# Altium footprint library 20210518.PcbLib: 414 footprints (part 7 of 26)
Each footprint in its own frame and in the unit in brackets; x right, y up, seen from the top. Pads: shape width x height; smd on the part's side, far side on the other; paste and mask are expansions set on the pad; w line width, h text height; cw(c..) or ccw(c..) is an arc to the next point about the centre after c.
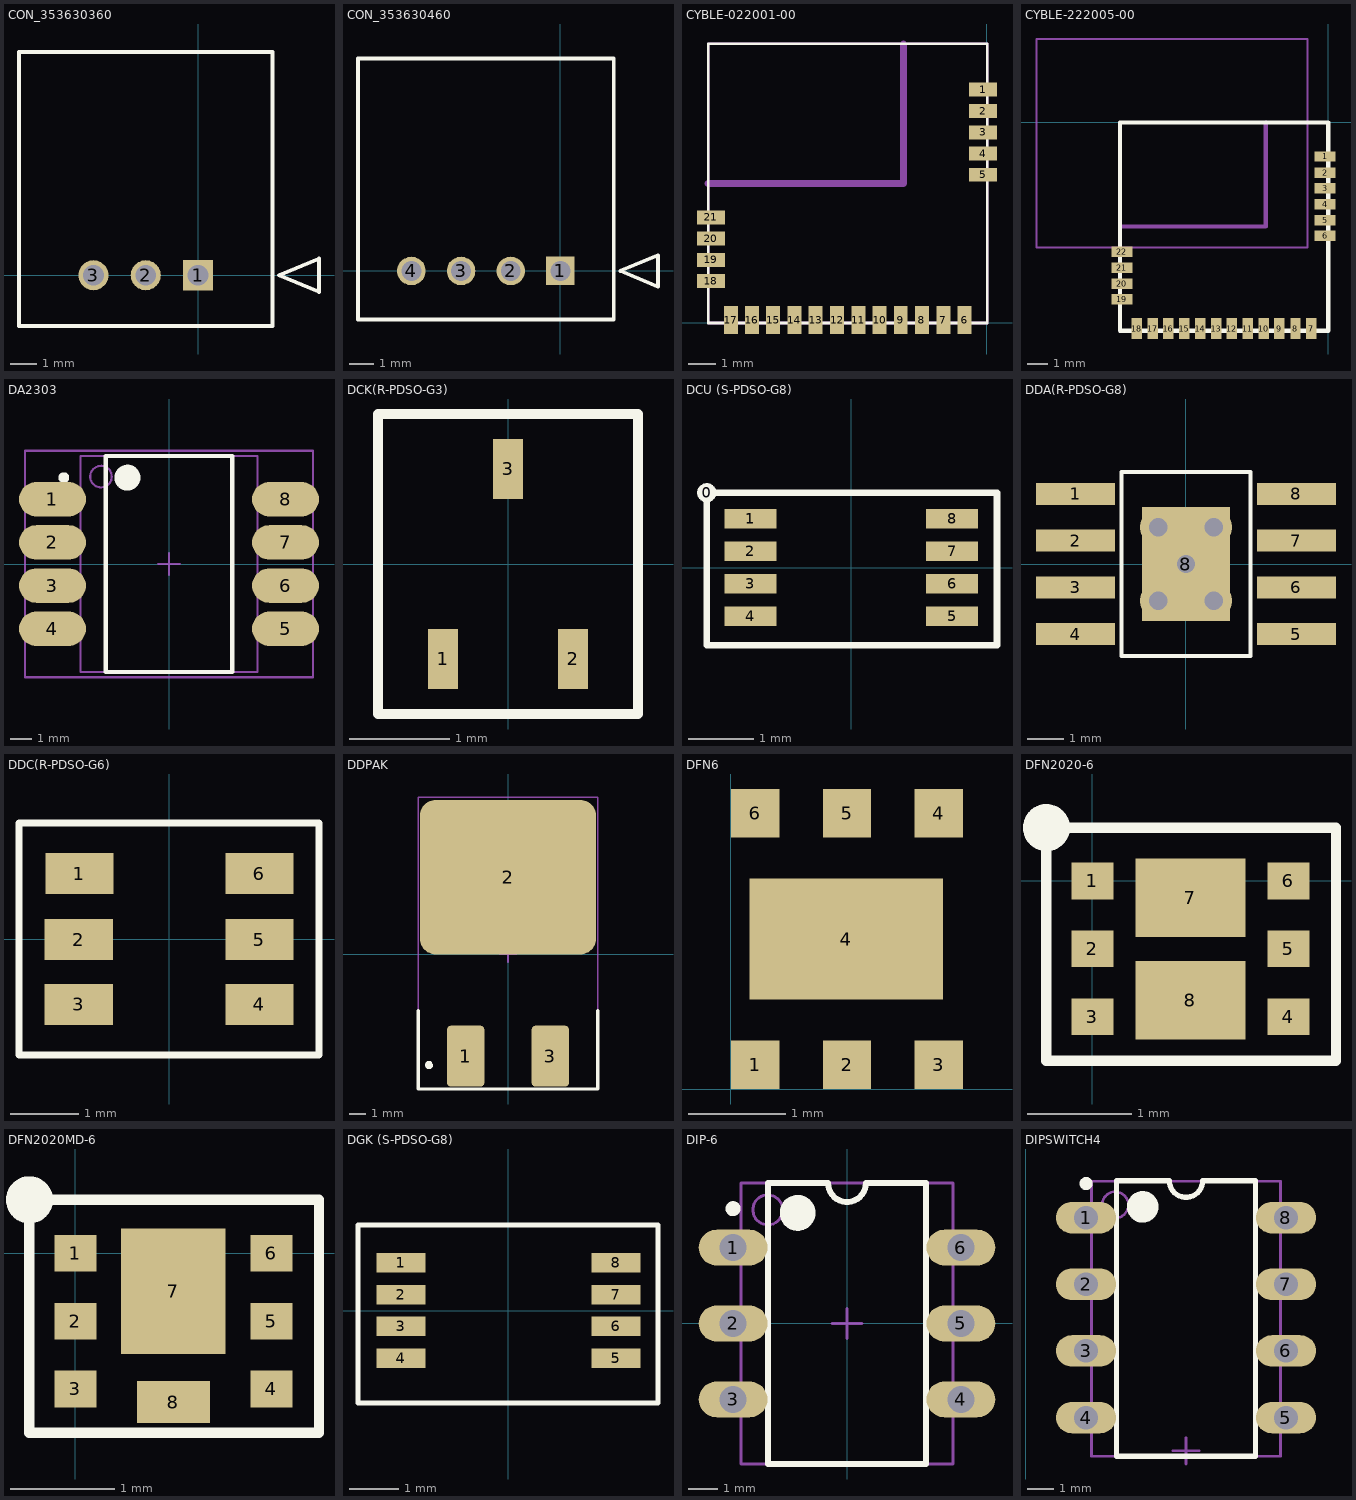
[diagram p6: the footprints below, top view; thin cyan lines are the x and y axes]

## CON_353630360 [mm]
pads (3):
  rect 1.15x1.15 hole 0.8 mask-25.4: 1(0,0)
  round 1.15 hole 0.8 mask-25.4: 2(-2,0) 3(-4,0)
Top Overlay:
  lines w0.152: -6.85,-1.95 -6.85,8.55 2.85,8.55 2.85,-1.95 -6.85,-1.95 ; 3.104,0 4.628,0.635 4.628,-0.635 3.104,0
Top Solder:
  region: -0.651,-0.651 0.651,-0.651 0.651,0.651 -0.651,0.651
  region: -2,0.657 -2.17,0.634 -2.328,0.569 -2.464,0.464 -2.569,0.328 -2.634,0.17 -2.657,0 -2.634,-0.17 -2.569,-0.328 -2.464,-0.464 -2.328,-0.569 -2.17,-0.634 -2,-0.657 -1.83,-0.634 -1.672,-0.569 -1.536,-0.464 -1.431,-0.328 -1.366,-0.17 -1.343,0 -1.366,0.17 -1.431,0.328 -1.536,0.464 -1.672,0.569 -1.83,0.634
  region: -4,0.657 -4.17,0.634 -4.328,0.569 -4.464,0.464 -4.569,0.328 -4.634,0.17 -4.657,0 -4.634,-0.17 -4.569,-0.328 -4.464,-0.464 -4.328,-0.569 -4.17,-0.634 -4,-0.657 -3.83,-0.634 -3.672,-0.569 -3.536,-0.464 -3.431,-0.328 -3.366,-0.17 -3.343,0 -3.366,0.17 -3.431,0.328 -3.536,0.464 -3.672,0.569 -3.83,0.634
Bottom Solder:
  region: -0.651,-0.651 0.651,-0.651 0.651,0.651 -0.651,0.651
  region: -2,0.657 -2.17,0.634 -2.328,0.569 -2.464,0.464 -2.569,0.328 -2.634,0.17 -2.657,0 -2.634,-0.17 -2.569,-0.328 -2.464,-0.464 -2.328,-0.569 -2.17,-0.634 -2,-0.657 -1.83,-0.634 -1.672,-0.569 -1.536,-0.464 -1.431,-0.328 -1.366,-0.17 -1.343,0 -1.366,0.17 -1.431,0.328 -1.536,0.464 -1.672,0.569 -1.83,0.634
  region: -4,0.657 -4.17,0.634 -4.328,0.569 -4.464,0.464 -4.569,0.328 -4.634,0.17 -4.657,0 -4.634,-0.17 -4.569,-0.328 -4.464,-0.464 -4.328,-0.569 -4.17,-0.634 -4,-0.657 -3.83,-0.634 -3.672,-0.569 -3.536,-0.464 -3.431,-0.328 -3.366,-0.17 -3.343,0 -3.366,0.17 -3.431,0.328 -3.536,0.464 -3.672,0.569 -3.83,0.634
3D body: height 5.55, standoff -3.15, extent -6.831,-2.008 2.869,8.492

## CON_353630460 [mm]
pads (4):
  rect 1.15x1.15 hole 0.8 mask-25.4: 1(0,0)
  round 1.15 hole 0.8 mask-25.4: 2(-2,0) 3(-4,0) 4(-6,0)
Top Overlay:
  lines w0.152: -8.15,-1.95 -8.15,8.55 2.15,8.55 2.15,-1.95 -8.15,-1.95 ; 2.404,0 3.928,0.635 3.928,-0.635 2.404,0
Top Solder:
  region: -0.651,-0.651 0.651,-0.651 0.651,0.651 -0.651,0.651
  region: -2,0.657 -2.17,0.634 -2.328,0.569 -2.464,0.464 -2.569,0.328 -2.634,0.17 -2.657,0 -2.634,-0.17 -2.569,-0.328 -2.464,-0.464 -2.328,-0.569 -2.17,-0.634 -2,-0.657 -1.83,-0.634 -1.672,-0.569 -1.536,-0.464 -1.431,-0.328 -1.366,-0.17 -1.343,0 -1.366,0.17 -1.431,0.328 -1.536,0.464 -1.672,0.569 -1.83,0.634
  region: -4,0.657 -4.17,0.634 -4.328,0.569 -4.464,0.464 -4.569,0.328 -4.634,0.17 -4.657,0 -4.634,-0.17 -4.569,-0.328 -4.464,-0.464 -4.328,-0.569 -4.17,-0.634 -4,-0.657 -3.83,-0.634 -3.672,-0.569 -3.536,-0.464 -3.431,-0.328 -3.366,-0.17 -3.343,0 -3.366,0.17 -3.431,0.328 -3.536,0.464 -3.672,0.569 -3.83,0.634
  region: -6,0.657 -6.17,0.634 -6.328,0.569 -6.464,0.464 -6.569,0.328 -6.634,0.17 -6.657,0 -6.634,-0.17 -6.569,-0.328 -6.464,-0.464 -6.328,-0.569 -6.17,-0.634 -6,-0.657 -5.83,-0.634 -5.672,-0.569 -5.536,-0.464 -5.431,-0.328 -5.366,-0.17 -5.343,0 -5.366,0.17 -5.431,0.328 -5.536,0.464 -5.672,0.569 -5.83,0.634
Bottom Solder:
  region: -0.651,-0.651 0.651,-0.651 0.651,0.651 -0.651,0.651
  region: -2,0.657 -2.17,0.634 -2.328,0.569 -2.464,0.464 -2.569,0.328 -2.634,0.17 -2.657,0 -2.634,-0.17 -2.569,-0.328 -2.464,-0.464 -2.328,-0.569 -2.17,-0.634 -2,-0.657 -1.83,-0.634 -1.672,-0.569 -1.536,-0.464 -1.431,-0.328 -1.366,-0.17 -1.343,0 -1.366,0.17 -1.431,0.328 -1.536,0.464 -1.672,0.569 -1.83,0.634
  region: -4,0.657 -4.17,0.634 -4.328,0.569 -4.464,0.464 -4.569,0.328 -4.634,0.17 -4.657,0 -4.634,-0.17 -4.569,-0.328 -4.464,-0.464 -4.328,-0.569 -4.17,-0.634 -4,-0.657 -3.83,-0.634 -3.672,-0.569 -3.536,-0.464 -3.431,-0.328 -3.366,-0.17 -3.343,0 -3.366,0.17 -3.431,0.328 -3.536,0.464 -3.672,0.569 -3.83,0.634
  region: -6,0.657 -6.17,0.634 -6.328,0.569 -6.464,0.464 -6.569,0.328 -6.634,0.17 -6.657,0 -6.634,-0.17 -6.569,-0.328 -6.464,-0.464 -6.328,-0.569 -6.17,-0.634 -6,-0.657 -5.83,-0.634 -5.672,-0.569 -5.536,-0.464 -5.431,-0.328 -5.366,-0.17 -5.343,0 -5.366,0.17 -5.431,0.328 -5.536,0.464 -5.672,0.569 -5.83,0.634
3D body: height 5.55, standoff -3.15, extent -8.223,-1.983 2.077,8.517

## CYBLE-022001-00 [mm] "EZ-BLE™ PRoC™ Module"
pads (21):
  rect 1x0.5 smd: 1(-0.141,8.344) 2(-0.141,7.574) 3(-0.141,6.814) 4(-0.141,6.054) 5(-0.141,5.294) 18(-9.888,1.484) 19(-9.888,2.244) 20(-9.888,3.004) 21(-9.888,3.764)
  rect 0.5x1 smd: 6(-0.798,0.084) 7(-1.558,0.084) 8(-2.328,0.084) 9(-3.088,0.084) 10(-3.848,0.084) 11(-4.608,0.084) 12(-5.368,0.084) 13(-6.138,0.084) 14(-6.898,0.084) 15(-7.658,0.084) 16(-8.418,0.084) 17(-9.178,0.084)
Top Overlay:
  lines w0.1: -9.988,-0.016 -9.988,9.984 0.012,9.984 0.012,-0.016 -9.988,-0.016
Mechanical 15:
  lines w0.1: -9.988,-0.016 0.012,-0.016 0.012,9.984 -9.988,9.984 -9.988,-0.016
  lines w0.254: -9.988,4.984 -2.988,4.984 -2.988,9.984
  text "Antenna area" at -9.388,7.384 h1
3D body: height 1.5, standoff 0, extent -9.988,-0.016 0.012,9.984

## CYBLE-222005-00 [mm] "EZ-BLE™ PRoC™ Module, flash: 256KB"
height 1.6
pads (22):
  rect 1x0.5 smd: 1(-0.152,-1.64) 2(-0.152,-2.41) 3(-0.152,-3.17) 4(-0.152,-3.93) 5(-0.152,-4.69) 6(-0.152,-5.45) 19(-9.9,-8.5) 20(-9.9,-7.74) 21(-9.9,-6.98) 22(-9.9,-6.22)
  rect 0.5x1 smd: 7(-0.81,-9.9) 8(-1.57,-9.9) 9(-2.34,-9.9) 10(-3.1,-9.9) 11(-3.86,-9.9) 12(-4.62,-9.9) 13(-5.38,-9.9) 14(-6.15,-9.9) 15(-6.91,-9.9) 16(-7.67,-9.9) 17(-8.43,-9.9) 18(-9.19,-9.9)
Top Overlay:
  lines w0.2: -10,-10 -10,0 0,0 0,-10 -10,-10
Mechanical 13:
  lines w0.1: -14,-6 -14,4 -1,4 -1,-6 -14,-6
  text "Antena Cut Out" at -10,2 h1
Mechanical 15:
  lines w0.1: -10,-10 0,-10 0,0 -10,0 -10,-10
  lines w0.2: -10,-5 -3,-5 -3,0
  text "Antenna area" at -9.4,-2.6 h1
3D body: height 1.5, standoff 0, extent -10,-10 0,0

## DA2303 [mm] "8-Leads, Body 10.0x8.2mm (max), Pitch 2.00mm, IPC Medium Density"
height 5.97
pads (8):
  oval 3.1x1.6 smd: 1(-5.4,3) 2(-5.4,1) 3(-5.4,-1) 4(-5.4,-3) 5(5.4,-3) 6(5.4,-1) 7(5.4,1) 8(5.4,3)
Top Overlay:
  circle w0.25: c-4.875,4 r0.125
  circle w0.6: c-1.925,4 r0.3
  lines w0.2: -2.925,-5 -2.925,5 2.925,5 2.925,-5 -2.925,-5
Mechanical 13:
  circle w0.1: c-3.15,4.05 r0.5
  lines w0.1: -4.1,-5 -4.1,5 4.1,5 4.1,-5 -4.1,-5
Mechanical 15:
  lines w0.1: -0.5,0 0.5,0 ; 0,-0.5 0,0.5 ; -6.675,-5.25 -6.675,5.25 6.675,5.25 6.675,-5.25 -6.675,-5.25
3D body: height 5.95, standoff -0.02, extent -6.01,-5.025 6.06,4.975

## DCK(R-PDSO-G3) [mm] "PLASTIC  SMALL OUTLINE PACKAGE"
height 1.1
pads (3):
  rect 0.3x0.6 smd: 1(-0.65,-0.95) 2(0.65,-0.95) 3(0,0.95)
Top Overlay:
  lines w0.1: -1.3,-1.5 1.3,-1.5 1.3,1.5 -1.3,1.5 -1.3,-1.5
3D body: height 0.15, standoff 0.1, extent 0.4,-1.2 0.9,-0.7
3D body: height 0.15, standoff 0.1, extent -0.9,-1.2 -0.4,-0.7
3D body: height 0.15, standoff 0.1, extent -0.25,0.7 0.25,1.2
3D body: height 1.11, standoff 1.1, extent -0.9,-0.45 -0.65,-0.2
3D body: height 1.1, standoff 0, extent -1.075,-0.7 1.075,0.7

## DCU (S-PDSO-G8) [mm] "PowerPAD PLASTIC  SMALL OUTLINE"
pads (9):
  round 0.3 on Top Overlay: 0(-2.22,1.15)
  rect 0.8x0.3 smd: 1(-1.55,0.75) 2(-1.55,0.25) 3(-1.55,-0.25) 4(-1.55,-0.75) 5(1.55,-0.75) 6(1.55,-0.25) 7(1.55,0.25) 8(1.55,0.75)
Top Overlay:
  lines w0.1: -2.22,-1.19 2.24,-1.19 2.24,1.15 -2.22,1.15 -2.22,-1.19
3D body: height 0.9, standoff 0, extent -1.587,-1.01 1.52,0.99

## DDA(R-PDSO-G8) [mm] "PowerPAD PLASTIC  SMALL OUTLINE"
pads (9):
  rect 2.15x0.6 smd: 1(-3,1.905) 2(-3,0.635) 3(-3,-0.635) 4(-3,-1.905) 5(3,-1.905) 6(3,-0.635) 7(3,0.635) 8(3,1.905)
  rect 2.4x3.1 smd: 8(0,0)
via -0.75,1 diameter 1 hole 0.5
via 0.75,1 diameter 1 hole 0.5
via 0.75,-1 diameter 1 hole 0.5
via -0.75,-1 diameter 1 hole 0.5
via 0,0 diameter 1 hole 0.5
Top Overlay:
  lines w0.1: -1.75,-2.5 -1.75,2.5 1.75,2.5 1.75,-2.5 -1.75,-2.5
3D body: height 1.7, standoff 0, extent -2.767,-2.426 3.227,2.4

## DDC(R-PDSO-G6) [mm] "TI"
height 1.1
pads (6):
  rect 1x0.6 smd: 1(-1.315,0.96) 2(-1.325,-0.01) 3(-1.325,-0.96) 4(1.325,-0.96) 5(1.325,-0.01) 6(1.325,0.96)
Top Overlay:
  lines w0.1: -2.2,-1.7 -2.2,1.7 2.2,1.7 2.2,-1.7 -2.2,-1.7
3D body: height 0.97, standoff 0, extent -1.4,-1.45 1.4,1.45

## DDPAK [mm] "TO-263-3, D²Pak (2 Leads + Tab), TO-263AB"
height 4.83
pads (3):
  rrect20% 2.32x3.81 smd: 1(-2.64,-6.35) 3(2.64,-6.35)
  rrect20% 11x9.65 smd: 2(0,4.825)
Top Overlay:
  lines w0.2: -5.6,-3.5 -5.6,-8.4 5.6,-8.4 5.6,-3.5
  lines w0.25: -4.86,-6.793 ccw(c-4.925,-6.9) -4.8,-6.9
Mechanical 13:
  lines w0.1: -5.6,-8.4 -5.6,9.8 5.6,9.8 5.6,-8.4 -5.6,-8.4
Mechanical 15:
  lines w0.1: -0.5,0 0.5,0 ; 0,-0.5 0,0.5
3D body: height 4.98, standoff -0.03, extent -5.08,-7.016 5.08,8.248

## DFN6 [mm] "DFN6 (3x3 mm)"
height 1
pads (7):
  rect 0.5x0.5 smd: 1(0.25,0.25) 2(1.2,0.25) 3(2.15,0.25) 4(2.15,2.85) 5(1.2,2.85) 6(0.25,2.85)
  rect 2x1.25 smd: 4(1.19,1.55)
3D body: height 0.75, standoff -0.05, extent -0.32,0 2.68,3.1

## DFN2020-6 [mm]
height 0.75
pads (8):
  rect 0.4x0.35 smd: 1(0,0) 2(0,-0.65) 3(0,-1.3) 4(1.875,-1.3) 5(1.875,-0.65) 6(1.875,0)
  rect 1.05x0.75 smd: 7(0.937,-0.16) 8(0.937,-1.14)
Top Overlay:
  circle w0.25: c-0.44,0.51 r0.1
  lines w0.1: -0.44,-1.72 2.33,-1.72 2.33,0.51 -0.44,0.51 -0.44,-1.72
3D body: height 0.77, standoff 0, extent -0.06,-1.65 1.94,0.35

## DFN2020MD-6 [mm]
height 0.75
pads (8):
  rect 0.4x0.35 smd: 1(0,0) 2(0,-0.65) 3(0,-1.3) 4(1.875,-1.3) 5(1.875,-0.65) 6(1.875,0)
  rect 1x1.2 smd: 7(0.937,-0.365)
  rect 0.7x0.4 smd: 8(0.937,-1.425)
Top Overlay:
  circle w0.25: c-0.44,0.51 r0.1
  lines w0.1: -0.44,-1.72 2.33,-1.72 2.33,0.51 -0.44,0.51 -0.44,-1.72
3D body: height 0.77, standoff 0, extent -0.06,-1.65 1.94,0.35

## DGK (S-PDSO-G8) [mm] "PowerPAD PLASTIC  SMALL OUTLINE"
pads (8):
  rect 1x0.4 smd: 1(-2.2,0.975) 2(-2.2,0.325) 3(-2.2,-0.325) 4(-2.2,-0.975) 5(2.2,-0.975) 6(2.2,-0.325) 7(2.2,0.325) 8(2.2,0.975)
Top Overlay:
  lines w0.1: -3.08,-1.895 3.06,-1.895 3.06,1.755 -3.08,1.755 -3.08,-1.895
3D body: height 0.94, standoff -0.02, extent -2.491,-1.483 2.411,1.514

## DIP-6 [mm]
pads (6):
  oval 2.3x1.2 hole 0.9: 1(-3.81,2.54) 2(-3.81,0) 3(-3.81,-2.54) 4(3.81,-2.54) 5(3.81,0) 6(3.81,2.54)
Top Overlay:
  circle w0.6: c-1.65,3.7 r0.3
  circle w0.25: c-3.81,3.84 r0.125
  lines w0.2: -2.65,-4.7 2.65,-4.7 2.65,4.7 0.635,4.7 cw(c0,4.7) -0.635,4.7 -2.65,4.7 -2.65,-4.7
Mechanical 13:
  circle w0.1: c-2.65,3.8 r0.5
  lines w0.1: -3.55,-4.7 3.55,-4.7 3.55,4.7 -3.55,4.7 -3.55,-4.7
Mechanical 15:
  lines w0.1: -0.5,0 0.5,0 ; 0,-0.5 0,0.5
3D body: height 4.7, standoff -2.6, extent -3.87,-3.56 4,3.56

## DIPSWITCH4 [mm]
pads (8):
  oval 2.3x1.2 hole 0.9: 1(2.29,13.09) 2(2.29,10.55) 3(2.29,8.01) 4(2.29,5.47) 5(9.91,5.47) 6(9.91,8.01) 7(9.91,10.55) 8(9.91,13.09)
Top Overlay:
  circle w0.25: c2.29,14.39 r0.125
  circle w0.6: c4.45,13.5 r0.3
  lines w0.2: 3.45,4 3.45,14.5 5.465,14.5 ccw(c6.1,14.5) 6.735,14.5 8.75,14.5 8.75,4 3.45,4
Mechanical 13:
  circle w0.1: c3.4,13.575 r0.5
  lines w0.1: 2.5,4 2.5,14.475 9.7,14.475 9.7,4 2.5,4
Mechanical 15:
  lines w0.1: 5.6,4.2 6.6,4.2 ; 6.1,3.7 6.1,4.7
3D body: height 7.52, standoff -2.57, extent 1.248,3.585 10.9,15.015